# Altium footprint library 二极管封装库.PcbLib: 222 footprints (part 1 of 14)
Each footprint in its own frame and in the unit in brackets; x right, y up, seen from the top. Pads: shape width x height; smd on the part's side, far side on the other; paste and mask are expansions set on the pad; w line width, h text height; cw(c..) or ccw(c..) is an arc to the next point about the centre after c.
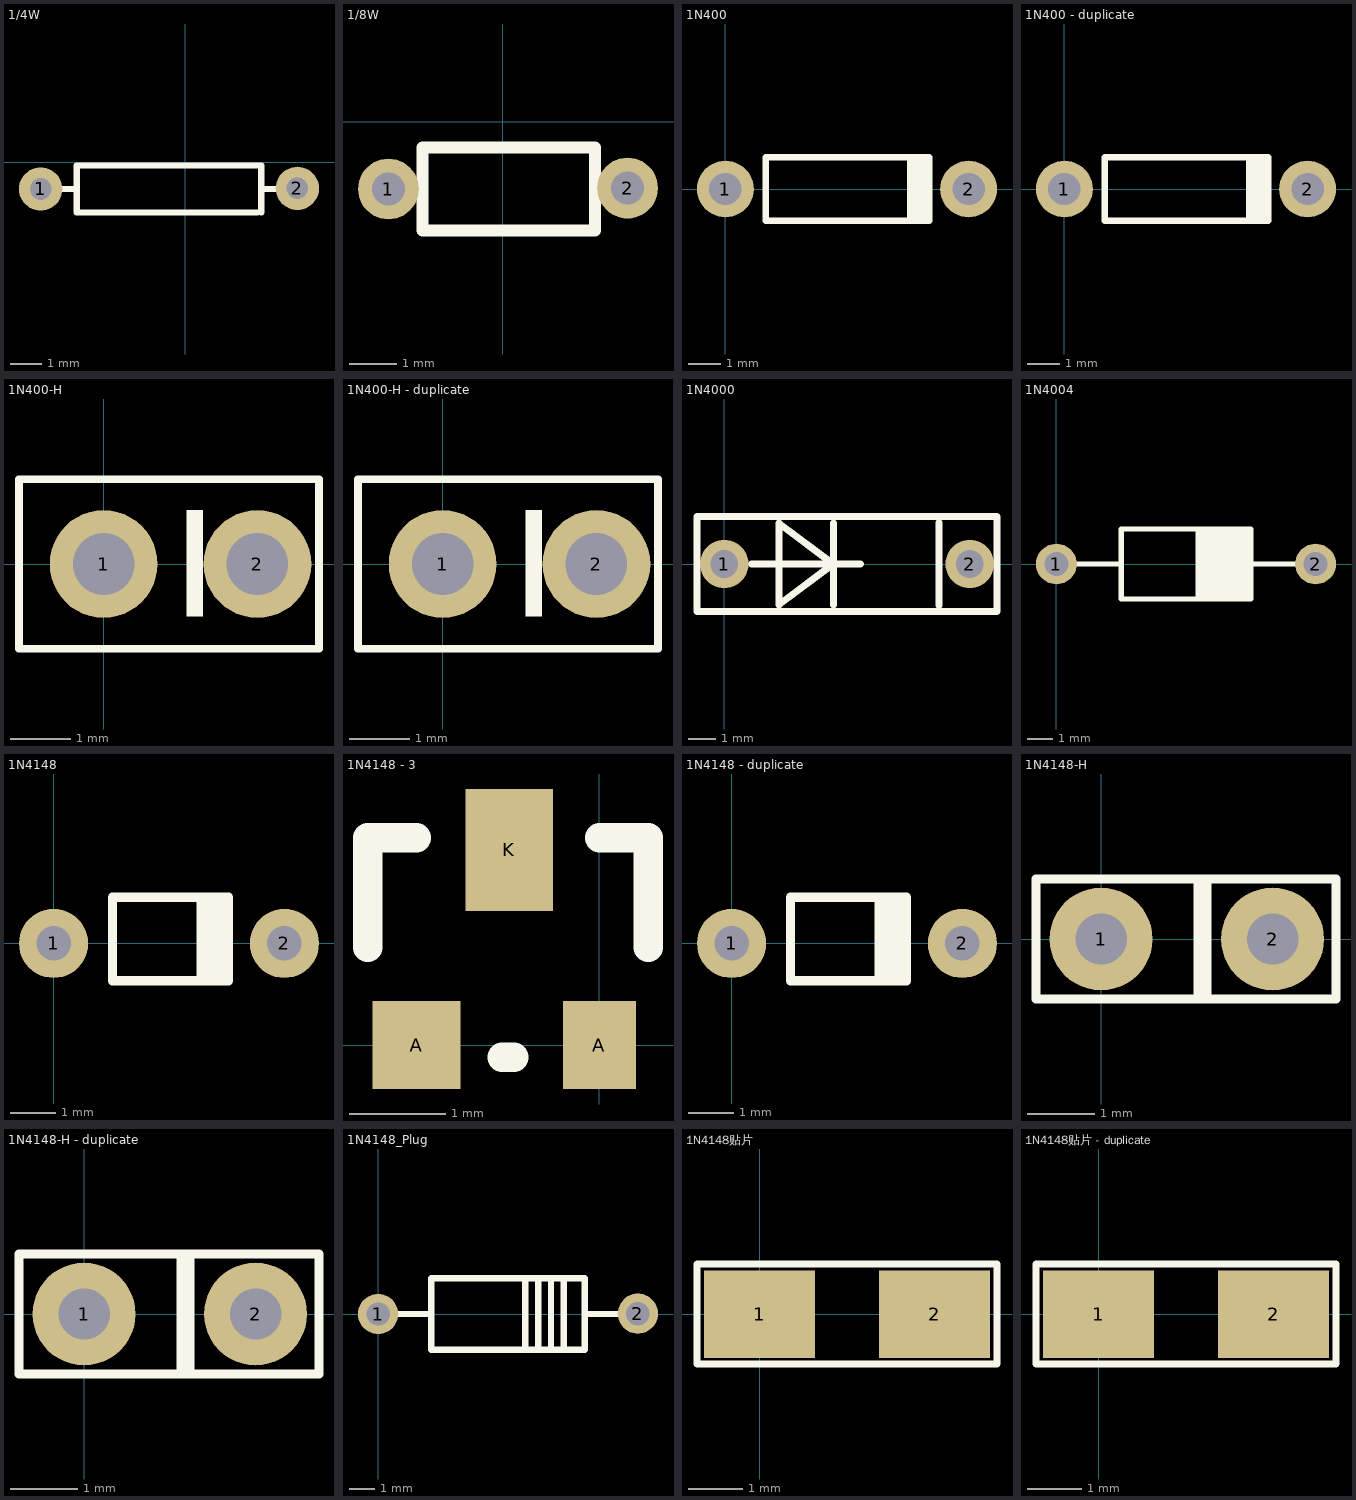
[diagram p0: the footprints below, top view; thin cyan lines are the x and y axes]

## 1/4W [mm]
pads (2):
  round 1.4 hole 0.7: 1(-4.68,-0.86) 2(3.62,-0.84)
Top Overlay:
  lines w0.203: -4.022,-0.86 -3.514,-0.86 ; 2.328,-1.622 -3.514,-1.622 -3.514,-0.098 2.455,-0.098 2.455,-1.622 ; 2.455,-0.86 2.963,-0.86

## 1/8W [mm]
pads (2):
  round 1.3 hole 0.7: 1(-2.44,-1.44) 2(2.66,-1.42)
Top Overlay:
  lines w0.254: -1.718,-2.329 1.965,-2.329 1.965,-0.551 -1.718,-0.551 -1.718,-2.329

## 1N400 [mil]
pads (2):
  round 70 hole 40: 1(0,0) 2(300,0)
Top Overlay:
  rectangle: 224,-39.37 255.5,39.37
  lines w7.87: 251.5,-39.37 50,-39.37 50,39.37 251.5,39.37
3D body "1N4007.STEP": height 110.61, standoff -60, extent -15.5,-52.5 315.5,52.5

## 1N400 - duplicate [mil]
pads (2):
  round 70 hole 40: 1(0,0) 2(300,0)
Top Overlay:
  rectangle: 224,-39.37 255.5,39.37
  lines w7.87: 251.5,-39.37 50,-39.37 50,39.37 251.5,39.37
3D body "1N4007.STEP": height 110.61, standoff -60, extent -15.5,-52.5 315.5,52.5

## 1N400-H [mil]
pads (2):
  round 70 hole 40: 1(0,0) 2(100,0)
Top Overlay:
  rectangle: 54,-34 64.5,35
  lines w5: -55,-55 -55,55 140,55 140,-55 -55,-55
3D body "1N4007_HL.STEP": height 270.46, standoff -60, extent -52,-52.5 116,52.5

## 1N400-H - duplicate [mil]
pads (2):
  round 70 hole 40: 1(0,0) 2(100,0)
Top Overlay:
  rectangle: 54,-34 64.5,35
  lines w5: -55,-55 140,-55 140,55 -55,55 -55,-55
3D body "1N4007_HL.STEP": height 270.46, standoff -60, extent -52,-52.5 116,52.5

## 1N4000 [mil]
pads (2):
  round 70 hole 40: 1(0,0) 2(354.33,0)
Top Overlay:
  lines w10: 39.37,0 196.85,0 ; 157.48,-59.05 157.48,59.05 ; 310,-60 310,60 ; -39.37,-68.74 -39.37,68.74 393.7,68.74 393.7,-68.74 -39.37,-68.74 ; 78.74,-59.05 157.48,0 78.74,59.05 78.74,-59.05

## 1N4004 [mil]
pads (2):
  round 62 hole 36: 1(0,0) 2(393.7,0)
Top Overlay:
  lines w5.91: 214.57,-53.15 214.57,53.15 ; 218.5,-53.15 218.5,53.15 ; 222.44,-53.15 222.44,53.15 ; 226.38,-53.15 226.38,53.15 ; 230.31,-53.15 230.31,53.15 ; 234.25,-53.15 234.25,53.15 ; 238.19,-53.15 238.19,53.15 ; 242.13,-53.15 242.13,53.15 ; 246.06,-53.15 246.06,53.15 ; 250,-53.15 250,53.15 ; 253.94,-53.15 253.94,53.15 ; 257.87,-53.15 257.87,53.15 ; 261.81,-53.15 261.81,53.15 ; 265.75,-53.15 265.75,53.15 ; 269.69,-53.15 269.69,53.15 ; 273.62,-53.15 273.62,53.15 ; 277.56,-53.15 277.56,53.15 ; 281.5,-53.15 281.5,53.15 ; 285.43,-53.15 285.43,53.15 ; 289.37,-53.15 289.37,53.15 ; 293.31,-53.15 293.31,53.15
  lines w7.87: 23.62,0 98.42,0 ; 295.28,0 370.08,0 ; 98.42,-53.15 98.42,53.15 295.28,53.15 295.28,-53.15 98.42,-53.15

## 1N4148 [mil]
pads (2):
  round 60 hole 30: 1(0,0) 2(200,0)
Top Overlay:
  rectangle: 124,-32 155.5,40
  lines w7.87: 151.5,-32.37 51,-32.37 51,40 151.5,40
3D body "1N4148.STEP": height 71.22, standoff -40, extent -8.5,-32 208.5,32.96

## 1N4148 - 3 [mil]
pads (3):
  rect 36x36 smd: A(-75,0)
  rect 30x36 smd: A(0,0)
  rect 36x50 smd: K(-37,80)
Top Overlay:
  lines w12: -95,40 -95,85 -75,85 ; -40,-5 -35,-5 ; 0,85 20,85 20,40

## 1N4148 - duplicate [mil]
pads (2):
  round 60 hole 30: 1(0,0) 2(200,0)
Top Overlay:
  rectangle: 124,-32 155.5,40
  lines w7.87: 151.5,-32.37 51,-32.37 51,40 151.5,40
3D body "1N4148.STEP": height 71.22, standoff -40, extent -8.5,-32 208.5,32.96

## 1N4148-H [mil]
pads (2):
  round 60 hole 30: 1(0,0) 2(100,0)
Top Overlay:
  rectangle: 54,-34 64.5,35
  lines w5: -38,-35 -38,35 137,35 137,-15 137,-35 -38,-35
3D body "1N4148_HL.STEP": height 196.61, standoff -60, extent -32.49,-32 108.49,32.96

## 1N4148-H - duplicate [mil]
pads (2):
  round 60 hole 30: 1(0,0) 2(100,0)
Top Overlay:
  rectangle: 54,-34 64.5,35
  lines w5: -38,-35 -38,35 137,35 137,-15 137,-35 -38,-35
3D body "1N4148_HL.STEP": height 196.61, standoff -60, extent -32.49,-32 108.49,32.96

## 1N4148_Plug [mil]
pads (2):
  round 62 hole 36: 1(0,0) 2(400,0.5)
Top Overlay:
  lines w9.84: 3.15,0 81.89,0 ; 226.77,-55.12 226.77,55.12 ; 246.46,-55.12 246.46,55.12 ; 266.14,-55.12 266.14,55.12 ; 285.83,-55.12 285.83,55.12 ; 396.85,0 318.11,0 ; 318.11,0 318.11,-55.12 81.89,-55.12 81.89,55.12 318.11,55.12 318.11,0

## 1N4148贴片 [mil]
pads (2):
  rect 80x63 smd: 1(0,0) 2(126,0)
Top Overlay:
  lines w5: -45,-36 -45,36 171,36 171,-36 -45,-36
3D body "SOD-80.STEP": height 59.06, standoff 0, extent -3.89,-29.52 133.9,29.53

## 1N4148贴片 - duplicate [mil]
pads (2):
  rect 80x63 smd: 1(0,0) 2(126,0)
Top Overlay:
  lines w5: -45,-36 171,-36 171,36 -45,36 -45,-36
3D body "SOD-80.STEP": height 59.06, standoff 0, extent -3.89,-29.52 133.9,29.53